# Altium footprint library SOURIAU THD.PcbLib: 34 footprints (part 2 of 5) (continued)
## SOURIAU_EDA-02444-V1-0 [mm] "Adapter Kit For PCB Mount For SOURIAU UTG02028S03, 28 Poles, Shell Size 20, Metalok Bantam Circular Female Connecteur" (continued)
Mechanical 14:
  drawing of 163 lines, arcs and shapes, not listed
  text "1" at -0.331,2.965 h1
  text "5" at 2.962,-2.053 h1
  text "10" at -8.041,1.315 h1
  text "15" at 11.634,-3.04 h1
  text "20" at 0,7.2 h1
  text "25" at -10.429,-5.998 h1
3D body "SOURIAU_EDA-02444-V1-0.stp": height 37, standoff -5.61, extent -18.375,-18.375 18.375,18.375

## SOURIAU_EDA-02510-V1-0 [mm] "Adapter Kit For PCB Mount For SOURIAU UTO02448P21T, 19 Poles, Shell Size 16, UT Bantam Circular Male Connector"
height 33.7
pads (23):
  round 1.9 hole 1.2: 1(0,0) 2(2.75,2.8) 3(3.8,-1) 4(1,-3.8) 5(-2.75,-2.8) 6(-3.8,1) 7(-1,3.8) 8(0,7.5) 9(3.75,6.5) 10(6.5,3.75) 11(7.5,0) 12(6.5,-3.75) 13(3.75,-6.5) 14(0,-7.5) 15(-3.75,-6.5) 16(-6.5,-3.75) 17(-7.5,0) 18(-6.5,3.75) 19(-3.75,6.5)
  round 6.2 hole 3.2: MECH1(-12.3,12.3) MECH2(12.3,12.3) MECH3(-12.3,-12.3) MECH4(12.3,-12.3)
Top Overlay:
  circle w0.2: c-3.75,-6.5 r1.5
  circle w0.2: c-3.75,-6.5 r1.6
  circle w0.2: c-3.75,-6.5 r1.6
  circle w0.2: c-2.75,-2.8 r1.5
  circle w0.2: c-2.75,-2.8 r1.6
  circle w0.2: c-2.75,-2.8 r1.6
  circle w0.2: c6.5,3.75 r1.5
  circle w0.2: c6.5,3.75 r1.6
  circle w0.2: c6.5,3.75 r1.6
  circle w0.2: c-3.75,6.5 r1.5
  circle w0.2: c-3.75,6.5 r1.6
  circle w0.2: c-3.75,6.5 r1.6
  circle w0.2: c-6.5,3.75 r1.6
  circle w0.2: c-7.5,0 r1.6
  circle w0.2: c-6.5,-3.75 r1.6
  circle w0.2: c0,-7.5 r1.6
  circle w0.2: c3.75,-6.5 r1.6
  circle w0.2: c6.5,-3.75 r1.6
  circle w0.2: c7.5,0 r1.6
  circle w0.2: c3.75,6.5 r1.6
  circle w0.2: c0,7.5 r1.6
  circle w0.2: c-1,3.8 r1.6
  circle w0.2: c-3.8,1 r1.6
  circle w0.2: c1,-3.8 r1.6
  circle w0.2: c3.8,-1 r1.6
  circle w0.2: c2.75,2.8 r1.6
  circle w0.2: c0,0 r1.5
  circle w0.2: c0,0 r1.6
  circle w0.2: c0,0 r1.6
  circle w0.2: c0,0 r12.65
  lines w0.2: -15.6,-11.134 -15.6,11.134 ; -11.397,5.489 -13.16,6.507 -12.215,8.143 -10.452,7.126 ; -11.134,-15.6 11.134,-15.6 ; -11.134,15.6 11.134,15.6 ; -7.088,-1.546 -6.912,-2.204 ; -7.088,1.546 -6.912,2.204 ; -5.369,-4.881 -4.881,-5.369 ; -5.369,4.881 -4.841,5.409 ; -4.867,9.473 ccw(c0,0) -10.426,-2.172 -11.442,-2.445 ccw(c0,0) -11.131,-3.604 -10.115,-3.332 ccw(c0,0) -7.294,-7.76 -7.97,-8.565 ccw(c0,0) -7.051,-9.337 -6.375,-8.531 ccw(c0,0) -4.454,-9.674 ; -3.374,-0.542 -3.176,-1.258 ; -2.669,2.131 -2.131,2.669 ; -2.204,-6.912 -1.546,-7.088 ; -1.955,10.469 cw(c0,0) -1.4,10.558 -1.4,11.616 cw(c0,0) 1.4,11.616 1.4,10.558 cw(c0,0) 7.083,7.953 ; -1.649,-10.521 ccw(c0,0) 5.607,-9.054 6.211,-9.916 ccw(c0,0) 7.194,-9.227 6.59,-8.366 ccw(c0,0) 10.54,-1.524 11.588,-1.616 ccw(c0,0) 11.693,-0.421 10.645,-0.329 ccw(c0,0) 8.834,5.948 ; -1.204,-3.212 -0.546,-3.388 ; -0.945,-12.615 -0.945,-14.65 0.945,-14.65 0.945,-12.615 ; -0.583,5.345 -0.417,5.955 ; 1.121,1.142 1.629,1.658 ; 1.546,-7.088 2.204,-6.912 ; 1.546,7.088 2.204,6.912 ; 1.875,0.75 2.075,0.925 2.075,-0.243 ; 1.889,-0.243 2.275,-0.243 ; 2.131,-2.669 2.669,-2.131 ; 3.176,1.258 3.374,0.542 ; 4.881,-5.369 5.369,-4.881 ; 4.881,5.369 5.369,4.881 ; 6.912,-2.204 7.088,-1.546 ; 6.912,2.204 7.088,1.546 ; 10.452,7.126 12.215,8.143 13.16,6.507 11.397,5.489 ; 15.6,-11.134 15.6,11.134
  text "5" at -1.8,-5.75 h1.2
  text "10" at 6.44,6.105 h1.2
  text "19" at -4.25,8.95 h1.2
  text "15" at -3.742,-9.976 h1.2
Mechanical 8:
  drawing of 184 lines, arcs and shapes, not listed
Mechanical 14:
  circle w0.1: c-3.75,-6.5 r1.6
  circle w0.1: c-2.75,-2.8 r1.6
  circle w0.1: c6.5,3.75 r1.6
  circle w0.1: c-3.75,6.5 r1.6
  circle w0.1: c-6.5,3.75 r1.6
  circle w0.1: c-7.5,0 r1.6
  circle w0.1: c-6.5,-3.75 r1.6
  circle w0.1: c0,-7.5 r1.6
  circle w0.1: c3.75,-6.5 r1.6
  circle w0.1: c6.5,-3.75 r1.6
  circle w0.1: c7.5,0 r1.6
  circle w0.1: c3.75,6.5 r1.6
  circle w0.1: c0,7.5 r1.6
  circle w0.1: c-1,3.8 r1.6
  circle w0.1: c-3.8,1 r1.6
  circle w0.1: c1,-3.8 r1.6
  circle w0.1: c3.8,-1 r1.6
  circle w0.1: c2.75,2.8 r1.6
  circle w0.1: c0,0 r1.6
  circle w0.1: c-12.3,12.3 r2.8
  circle w0.1: c12.3,12.3 r2.8
  circle w0.1: c12.3,-12.3 r2.8
  circle w0.1: c-12.3,-12.3 r2.8
  circle w0.1: c0,0 r12.65
  lines w0.1: -11.397,5.489 -13.16,6.507 -12.215,8.143 -10.452,7.126 ; -7.088,-1.546 -6.912,-2.204 ; -7.088,1.546 -6.912,2.204 ; -5.369,-4.881 -4.881,-5.369 ; -5.369,4.881 -4.9,5.35 ; -3.374,-0.542 -3.176,-1.258 ; -2.669,2.131 -2.131,2.669 ; -2.204,-6.912 -1.546,-7.088 ; -1.204,-3.212 -0.546,-3.388 ; -0.945,-12.615 -0.945,-14.65 0.945,-14.65 0.945,-12.615 ; -0.583,5.345 -0.417,5.955 ; 1.121,1.142 1.629,1.658 ; 1.546,-7.088 2.204,-6.912 ; 1.546,7.088 2.204,6.912 ; 2.131,-2.669 2.669,-2.131 ; 3.176,1.258 3.374,0.542 ; 4.881,-5.369 5.369,-4.881 ; 4.881,5.369 5.369,4.881 ; 6.912,-2.204 7.088,-1.546 ; 6.912,2.204 7.088,1.546 ; 10.452,7.126 12.215,8.143 13.16,6.507 11.397,5.489 ; -15.6,-14.1 -15.6,14.1 -14.1,15.6 14.1,15.6 15.6,14.1 15.6,-14.1 14.1,-15.6 -14.1,-15.6 -15.6,-14.1 ; -13.462,-12.656 ccw(c-13.27,-12.86) -13.19,-13.128 cw(c-13.049,-13.598) -12.572,-13.485 ccw(c-12.3,-13.42) -12.028,-13.485 cw(c-11.551,-13.598) -11.41,-13.128 ccw(c-11.33,-12.86) -11.138,-12.656 cw(c-10.802,-12.3) -11.138,-11.944 ccw(c-11.33,-11.74) -11.41,-11.472 cw(c-11.551,-11.002) -12.028,-11.115 ccw(c-12.3,-11.18) -12.572,-11.115 cw(c-13.049,-11.002) -13.19,-11.472 ccw(c-13.27,-11.74) -13.462,-11.944 cw(c-13.798,-12.3) -13.462,-12.656 ; -13.462,11.944 ccw(c-13.27,11.74) -13.19,11.472 cw(c-13.049,11.002) -12.572,11.115 ccw(c-12.3,11.18) -12.028,11.115 cw(c-11.551,11.002) -11.41,11.472 ccw(c-11.33,11.74) -11.138,11.944 cw(c-10.802,12.3) -11.138,12.656 ccw(c-11.33,12.86) -11.41,13.128 cw(c-11.551,13.598) -12.028,13.485 ccw(c-12.3,13.42) -12.572,13.485 cw(c-13.049,13.598) -13.19,13.128 ccw(c-13.27,12.86) -13.462,12.656 cw(c-13.798,12.3) -13.462,11.944 ; -11.442,-2.445 ccw(c0,0) -11.131,-3.604 -10.115,-3.332 ccw(c0,0) -7.294,-7.76 -7.97,-8.565 ccw(c0,0) -7.051,-9.337 -6.375,-8.531 ccw(c0,0) 5.607,-9.054 6.211,-9.916 ccw(c0,0) 7.194,-9.227 6.59,-8.366 ccw(c0,0) 10.54,-1.524 11.588,-1.616 ccw(c0,0) 11.693,-0.421 10.645,-0.329 ccw(c0,0) 1.4,10.558 1.4,11.616 ccw(c0,0) -1.4,11.616 -1.4,10.558 ccw(c0,0) -10.426,-2.172 -11.442,-2.445 ; 11.138,-12.656 ccw(c11.33,-12.86) 11.41,-13.128 cw(c11.551,-13.598) 12.028,-13.485 ccw(c12.3,-13.42) 12.572,-13.485 cw(c13.049,-13.598) 13.19,-13.128 ccw(c13.27,-12.86) 13.462,-12.656 cw(c13.798,-12.3) 13.462,-11.944 ccw(c13.27,-11.74) 13.19,-11.472 cw(c13.049,-11.002) 12.572,-11.115 ccw(c12.3,-11.18) 12.028,-11.115 cw(c11.551,-11.002) 11.41,-11.472 ccw(c11.33,-11.74) 11.138,-11.944 cw(c10.802,-12.3) 11.138,-12.656 ; 11.138,11.944 ccw(c11.33,11.74) 11.41,11.472 cw(c11.551,11.002) 12.028,11.115 ccw(c12.3,11.18) 12.572,11.115 cw(c13.049,11.002) 13.19,11.472 ccw(c13.27,11.74) 13.462,11.944 cw(c13.798,12.3) 13.462,12.656 ccw(c13.27,12.86) 13.19,13.128 cw(c13.049,13.598) 12.572,13.485 ccw(c12.3,13.42) 12.028,13.485 cw(c11.551,13.598) 11.41,13.128 ccw(c11.33,12.86) 11.138,12.656 cw(c10.802,12.3) 11.138,11.944
  text "15" at -4.607,-7.1 h1
  text "5" at -3.15,-3.4 h1
  text "10" at 5.643,3.15 h1
  text "19" at -4.579,5.9 h1
  text "1" at -0.143,-0.6 h1
3D body "SOURIAU_EDA-02510-V1-0.stp": height 33.7, standoff -13.8, extent -15.6,-15.6 15.6,15.6

## SOURIAU_EDA-02569-V1-0 [mm] "Adapter Kit For PCB Mount For SOURIAU UTO0104S21T, 4 Poles, Shell Size 10, UT Bantam Circular Female Connector. UTO Series"
height 24.3
pads (8):
  round 1.9 hole 1.2: 1(0,3) 2(-3,0) 3(0,-3) 4(3,0)
  round 6.2 hole 3.2: MECH1(-9.13,9.13) MECH2(-9.13,-9.13) MECH3(9.13,-9.13) MECH4(9.13,9.13)
Top Overlay:
  circle w0.2: c3,0 r1.6
  circle w0.2: c0,-3 r1.6
  circle w0.2: c-3,0 r1.6
  circle w0.2: c0,3 r1.5
  circle w0.2: c0,3 r1.7
  circle w0.2: c0,0 r7.455
  circle w0.2: c0,0 r5.15
  lines w0.2: -11.91,-6.5 -11.91,6.5 ; -6.877,2.879 -7.819,3.423 cw(c0,0) -6.472,5.564 -4.962,5.564 ; -6.5,-11.91 6.5,-11.91 ; -6.5,11.91 6.5,11.91 ; -2.337,-7.079 -1.582,-8.387 ccw(c0,0) 0.945,-8.483 0.945,-7.395 ; -1.869,-1.131 -1.131,-1.869 ; -1.869,1.131 -1.131,1.869 ; 1.131,-1.869 1.869,-1.131 ; 5.932,4.516 6.874,5.06 cw(c0,0) 8.054,2.823 7.299,1.516 ; 11.91,-6.5 11.91,6.5 ; -6.785,-0.938 ccw(c0,0) -6.345,-2.58 -5.795,-2.433 ccw(c0,0) -4.654,-4.224 -5.02,-4.66 ccw(c0,0) -3.718,-5.753 -3.352,-5.317 ccw(c0,0) 2.876,-5.589 3.202,-6.055 ccw(c0,0) 4.595,-5.08 4.268,-4.614 ccw(c0,0) 6.129,-1.39 6.697,-1.439 ccw(c0,0) 6.845,0.254 6.278,0.304 ccw(c0,0) 1.65,6.065 1.65,6.648 ccw(c0,0) -1.65,6.648 -1.65,6.065 ccw(c0,0) -6.235,-0.791 -6.785,-0.938
  text "4" at 2.375,2.15 h1.2
  text "1" at -2.8,2.375 h1.2
  text "2" at -3.15,-3.4 h1.2
  text "3" at 2.275,-3.45 h1.2
Mechanical 8:
  lines w0.1: -9.63,-9.13 -9.13,-9.13 ; -9.63,9.13 -9.13,9.13 ; -9.13,-9.63 -9.13,-9.13 ; -9.13,-8.63 -9.13,-9.13 ; -9.13,8.63 -9.13,9.13 ; -9.13,9.63 -9.13,9.13 ; -8.63,-9.13 -9.13,-9.13 ; -8.63,9.13 -9.13,9.13 ; -3.5,0 -3,0 ; -3,-0.5 -3,0 ; -3,0.5 -3,0 ; -2.5,0 -3,0 ; -0.5,-3 0,-3 ; -0.5,0 0,0 ; -0.5,3 0,3 ; 0,-3.5 0,-3 ; 0,-2.5 0,-3 ; 0,-0.5 0,0 ; 0,0.5 0,0 ; 0,2.5 0,3 ; 0,3.5 0,3 ; 0.5,-3 0,-3 ; 0.5,0 0,0 ; 0.5,3 0,3 ; 2.5,0 3,0 ; 3,-0.5 3,0 ; 3,0.5 3,0 ; 3.5,0 3,0 ; 8.63,-9.13 9.13,-9.13 ; 8.63,9.13 9.13,9.13 ; 9.13,-9.63 9.13,-9.13 ; 9.13,-8.63 9.13,-9.13 ; 9.13,8.63 9.13,9.13 ; 9.13,9.63 9.13,9.13 ; 9.63,-9.13 9.13,-9.13 ; 9.63,9.13 9.13,9.13
Mechanical 14:
  circle w0.1: c-9.13,-9.13 r2.8
  circle w0.1: c9.13,-9.13 r2.8
  circle w0.1: c9.13,9.13 r2.8
  circle w0.1: c-9.13,9.13 r2.8
  circle w0.1: c0,0 r5.15
  circle w0.1: c0,0 r7.455
  circle w0.1: c3,0 r1.6
  circle w0.1: c0,-3 r1.6
  circle w0.1: c-3,0 r1.6
  circle w0.1: c0,3 r1.6
  lines w0.1: -6.877,2.879 -7.819,3.423 cw(c0,0) -6.472,5.564 -4.962,5.564 ; -2.337,-7.079 -1.582,-8.387 ccw(c0,0) 0.945,-8.483 0.945,-7.395 ; -1.869,-1.131 -1.131,-1.869 ; -1.869,1.131 -1.131,1.869 ; 1.131,-1.869 1.869,-1.131 ; 5.932,4.516 6.874,5.06 cw(c0,0) 8.054,2.823 7.299,1.516 ; -11.91,-10.229 -11.91,10.229 -10.229,11.91 10.229,11.91 11.91,10.229 11.91,-10.229 10.229,-11.91 -10.229,-11.91 -11.91,-10.229 ; -10.292,-9.486 ccw(c-10.1,-9.69) -10.02,-9.958 cw(c-9.879,-10.428) -9.402,-10.315 ccw(c-9.13,-10.25) -8.858,-10.315 cw(c-8.381,-10.428) -8.24,-9.958 ccw(c-8.16,-9.69) -7.968,-9.486 cw(c-7.632,-9.13) -7.968,-8.774 ccw(c-8.16,-8.57) -8.24,-8.302 cw(c-8.381,-7.832) -8.858,-7.945 ccw(c-9.13,-8.01) -9.402,-7.945 cw(c-9.879,-7.832) -10.02,-8.302 ccw(c-10.1,-8.57) -10.292,-8.774 cw(c-10.628,-9.13) -10.292,-9.486 ; -10.292,8.774 ccw(c-10.1,8.57) -10.02,8.302 cw(c-9.879,7.832) -9.402,7.945 ccw(c-9.13,8.01) -8.858,7.945 cw(c-8.381,7.832) -8.24,8.302 ccw(c-8.16,8.57) -7.968,8.774 cw(c-7.632,9.13) -7.968,9.486 ccw(c-8.16,9.69) -8.24,9.958 cw(c-8.381,10.428) -8.858,10.315 ccw(c-9.13,10.25) -9.402,10.315 cw(c-9.879,10.428) -10.02,9.958 ccw(c-10.1,9.69) -10.292,9.486 cw(c-10.628,9.13) -10.292,8.774 ; -6.785,-0.938 ccw(c0,0) -6.345,-2.58 -5.795,-2.433 ccw(c0,0) -4.654,-4.224 -5.02,-4.66 ccw(c0,0) -3.718,-5.753 -3.352,-5.317 ccw(c0,0) 2.876,-5.589 3.202,-6.055 ccw(c0,0) 4.595,-5.08 4.268,-4.614 ccw(c0,0) 6.129,-1.39 6.697,-1.439 ccw(c0,0) 6.845,0.254 6.278,0.304 ccw(c0,0) 1.65,6.065 1.65,6.648 ccw(c0,0) -1.65,6.648 -1.65,6.065 ccw(c0,0) -6.235,-0.791 -6.785,-0.938 ; 7.968,-9.486 ccw(c8.16,-9.69) 8.24,-9.958 cw(c8.381,-10.428) 8.858,-10.315 ccw(c9.13,-10.25) 9.402,-10.315 cw(c9.879,-10.428) 10.02,-9.958 ccw(c10.1,-9.69) 10.292,-9.486 cw(c10.628,-9.13) 10.292,-8.774 ccw(c10.1,-8.57) 10.02,-8.302 cw(c9.879,-7.832) 9.402,-7.945 ccw(c9.13,-8.01) 8.858,-7.945 cw(c8.381,-7.832) 8.24,-8.302 ccw(c8.16,-8.57) 7.968,-8.774 cw(c7.632,-9.13) 7.968,-9.486 ; 7.968,8.774 ccw(c8.16,8.57) 8.24,8.302 cw(c8.381,7.832) 8.858,7.945 ccw(c9.13,8.01) 9.402,7.945 cw(c9.879,7.832) 10.02,8.302 ccw(c10.1,8.57) 10.292,8.774 cw(c10.628,9.13) 10.292,9.486 ccw(c10.1,9.69) 10.02,9.958 cw(c9.879,10.428) 9.402,10.315 ccw(c9.13,10.25) 8.858,10.315 cw(c8.381,10.428) 8.24,9.958 ccw(c8.16,9.69) 7.968,9.486 cw(c7.632,9.13) 7.968,8.774
  text "2" at -3.4,-0.6 h1.2
  text "3" at -0.4,-3.6 h1.2
  text "4" at 2.571,-0.6 h1.2
  text "1" at -0.143,2.4 h1.2
3D body "SOURIAU_EDA-02569-V1-0.stp": height 32.93, standoff -5.89, extent -12.23,-12.223 12.23,12.224

## SOURIAU_EDA-02570-V1-0 [mm] "Adapter Kit For PCB Mount For SOURIAU UTO01412S21T, 12 Poles, Shell Size 14, UT Bantam Circular Female Connecteur"
height 32.93
pads (16):
  round 1.9 hole 1.2: 1(-1.45,1.5) 2(-0.75,-2.2) 3(2.25,0.35) 4(5.15,2.95) 5(2,5.55) 6(-2,5.55) 7(-5.15,2.95) 8(-5.85,-1.05) 9(-3.85,-4.55) 10(0,-5.95) 11(3.85,-4.55) 12(5.85,-1.09)
  round 6.2 hole 3.2: MECH1(-11.505,11.505) MECH2(11.505,11.505) MECH3(-11.505,-11.505) MECH4(11.505,-11.505)
Top Overlay:
  circle w0.2: c-2,5.55 r1.6
  circle w0.2: c2,5.55 r1.7
  circle w0.2: c5.15,2.95 r1.6
  circle w0.2: c-5.15,2.95 r1.6
  circle w0.2: c-1.45,1.5 r1.7
  circle w0.2: c2.25,0.35 r1.6
  circle w0.2: c5.85,-1.09 r1.7
  circle w0.2: c3.85,-4.55 r1.6
  circle w0.2: c0,-5.95 r1.6
  circle w0.2: c-0.75,-2.2 r1.6
  circle w0.2: c-3.85,-4.55 r1.6
  circle w0.2: c-5.85,-1.05 r1.6
  circle w0.2: c-1.45,1.5 r1.5
  circle w0.2: c2,5.55 r1.5
  circle w0.2: c5.85,-1.09 r1.5
  circle w0.2: c0.043,-0.043 r11.113
  lines w0.2: -14.285,-8.914 -14.285,8.914 ; -10.012,4.689 -11.176,5.361 cw(c0,0) -9.541,7.913 -7.717,7.913 ; -8.914,-14.285 8.914,-14.285 ; -8.914,14.285 8.914,14.285 ; -5.574,0.526 -5.426,1.374 ; -5.056,-2.439 -4.644,-3.161 ; -3.916,3.969 -3.234,4.531 ; -2.93,-10.75 -2.082,-12.219 ccw(c0,0) 0.945,-12.359 0.945,-11.119 ; -2.346,-5.097 -1.504,-5.403 ; -1.153,-0.072 -1.047,-0.628 ; -0.4,5.55 0.4,5.55 ; 0.469,-1.164 1.031,-0.686 ; 1.504,-5.403 2.346,-5.097 ; 3.234,4.531 3.916,3.969 ; 3.441,1.418 3.959,1.882 ; 3.681,7.467 ccw(c0,0) 6.533,-5.16 ; 4.651,-3.165 5.049,-2.475 ; 6.161,5.599 cw(c0,0) 8.013,-2.258 ; 7.608,-5.452 cw(c0,0) 6.043,-7.148 6.604,-7.95 cw(c0,0) 5.212,-8.925 4.65,-8.123 cw(c0,0) -5.34,-7.687 -5.97,-8.437 cw(c0,0) -7.272,-7.344 -6.643,-6.594 cw(c0,0) -8.784,-3.234 -9.729,-3.487 cw(c0,0) -10.169,-1.845 -9.224,-1.592 cw(c0,0) -1.65,9.213 -1.65,10.202 cw(c0,0) 1.65,10.202 1.65,9.213 cw(c0,0) 9.36,0.034 10.335,-0.051 cw(c0,0) 10.187,-1.744 9.212,-1.659 cw(c0,0) 9.006,-2.551 ; 9.126,6.36 10.231,6.998 cw(c0,0) 11.623,4.306 10.775,2.838 ; 14.285,-8.914 14.285,8.914
  text "1" at -3.475,-1.3 h1.2
  text "5" at 4.275,5.525 h1.2
  text "12" at 7.075,-4.55 h1.2
Mechanical 8:
  lines w0.1: -12.005,-11.505 -11.505,-11.505 ; -12.005,11.505 -11.505,11.505 ; -11.505,-12.005 -11.505,-11.505 ; -11.505,-11.005 -11.505,-11.505 ; -11.505,11.005 -11.505,11.505 ; -11.505,12.005 -11.505,11.505 ; -11.005,-11.505 -11.505,-11.505 ; -11.005,11.505 -11.505,11.505 ; -6.35,-1.05 -5.85,-1.05 ; -5.85,-1.55 -5.85,-1.05 ; -5.85,-0.55 -5.85,-1.05 ; -5.65,2.95 -5.15,2.95 ; -5.35,-1.05 -5.85,-1.05 ; -5.15,2.45 -5.15,2.95 ; -5.15,3.45 -5.15,2.95 ; -4.65,2.95 -5.15,2.95 ; -4.35,-4.55 -3.85,-4.55 ; -3.85,-5.05 -3.85,-4.55 ; -3.85,-4.05 -3.85,-4.55 ; -3.35,-4.55 -3.85,-4.55 ; -2.5,5.55 -2,5.55 ; -2,5.05 -2,5.55 ; -2,6.05 -2,5.55 ; -1.95,1.5 -1.45,1.5 ; -1.5,5.55 -2,5.55 ; -1.45,1 -1.45,1.5 ; -1.45,2 -1.45,1.5 ; -1.25,-2.2 -0.75,-2.2 ; -0.95,1.5 -1.45,1.5 ; -0.75,-2.7 -0.75,-2.2 ; -0.75,-1.7 -0.75,-2.2 ; -0.5,-5.95 0,-5.95 ; -0.354,-0.354 0,0 ; -0.354,0.354 0,0 ; -0.25,-2.2 -0.75,-2.2 ; 0,-6.45 0,-5.95 ; 0,-5.45 0,-5.95 ; 0.354,-0.354 0,0 ; 0.354,0.354 0,0 ; 0.5,-5.95 0,-5.95 ; 1.5,5.55 2,5.55 ; 1.75,0.35 2.25,0.35 ; 2,5.05 2,5.55 ; 2,6.05 2,5.55 ; 2.25,-0.15 2.25,0.35 ; 2.25,0.85 2.25,0.35 ; 2.5,5.55 2,5.55 ; 2.75,0.35 2.25,0.35 ; 3.35,-4.55 3.85,-4.55 ; 3.85,-5.05 3.85,-4.55 ; 3.85,-4.05 3.85,-4.55 ; 4.35,-4.55 3.85,-4.55 ; 4.65,2.95 5.15,2.95 ; 5.15,2.45 5.15,2.95 ; 5.15,3.45 5.15,2.95 ; 5.35,-1.09 5.85,-1.09 ; 5.65,2.95 5.15,2.95 ; 5.85,-1.59 5.85,-1.09 ; 5.85,-0.59 5.85,-1.09 ; 6.35,-1.09 5.85,-1.09 ; 11.005,-11.505 11.505,-11.505 ; 11.005,11.505 11.505,11.505 ; 11.505,-12.005 11.505,-11.505 ; 11.505,-11.005 11.505,-11.505 ; 11.505,11.005 11.505,11.505 ; 11.505,12.005 11.505,11.505 ; 12.005,-11.505 11.505,-11.505 ; 12.005,11.505 11.505,11.505
Mechanical 14:
  circle w0.1: c0.043,-0.043 r11.113
  circle w0.1: c0,0 r8.325
  circle w0.1: c-2,5.55 r1.6
  circle w0.1: c2,5.55 r1.6
  circle w0.1: c5.15,2.95 r1.6
  circle w0.1: c-5.15,2.95 r1.6
  circle w0.1: c-1.45,1.5 r1.6
  circle w0.1: c2.25,0.35 r1.6
  circle w0.1: c5.85,-1.09 r1.6
  circle w0.1: c3.85,-4.55 r1.6
  circle w0.1: c0,-5.95 r1.6
  circle w0.1: c-0.75,-2.2 r1.6
  circle w0.1: c-3.85,-4.55 r1.6
  circle w0.1: c-5.85,-1.05 r1.6
  circle w0.1: c11.505,11.505 r2.8
  circle w0.1: c-11.505,11.505 r2.8
  circle w0.1: c-11.505,-11.505 r2.8
  circle w0.1: c11.505,-11.505 r2.8
  lines w0.1: -10.012,4.689 -11.176,5.361 cw(c0,0) -9.541,7.913 -7.717,7.913 ; -5.574,0.526 -5.426,1.374 ; -5.056,-2.439 -4.644,-3.161 ; -3.916,3.969 -3.234,4.531 ; -2.93,-10.75 -2.082,-12.219 ccw(c0,0) 0.945,-12.359 0.945,-11.119 ; -2.346,-5.097 -1.504,-5.403 ; -1.153,-0.072 -1.047,-0.628 ; -0.4,5.55 0.4,5.55 ; 0.469,-1.164 1.031,-0.686 ; 1.504,-5.403 2.346,-5.097 ; 3.234,4.531 3.916,3.969 ; 3.441,1.418 3.959,1.882 ; 4.651,-3.165 5.049,-2.475 ; 9.126,6.36 10.231,6.998 cw(c0,0) 11.623,4.306 10.775,2.838 ; -14.285,-12.603 -12.603,-14.285 12.603,-14.285 14.285,-12.603 14.285,12.603 12.603,14.285 -12.603,14.285 -14.285,12.603 -14.285,-12.603 ; -12.667,-11.861 ccw(c-13.003,-11.505) -12.667,-11.149 cw(c-12.475,-10.945) -12.395,-10.677 ccw(c-12.254,-10.207) -11.777,-10.32 cw(c-11.505,-10.385) -11.233,-10.32 ccw(c-10.756,-10.207) -10.615,-10.677 cw(c-10.535,-10.945) -10.343,-11.149 ccw(c-10.007,-11.505) -10.343,-11.861 cw(c-10.535,-12.065) -10.615,-12.333 ccw(c-10.756,-12.803) -11.233,-12.69 cw(c-11.505,-12.625) -11.777,-12.69 ccw(c-12.254,-12.803) -12.395,-12.333 cw(c-12.475,-12.065) -12.667,-11.861 ; -12.667,11.149 ccw(c-13.003,11.505) -12.667,11.861 cw(c-12.475,12.065) -12.395,12.333 ccw(c-12.254,12.803) -11.777,12.69 cw(c-11.505,12.625) -11.233,12.69 ccw(c-10.756,12.803) -10.615,12.333 cw(c-10.535,12.065) -10.343,11.861 ccw(c-10.007,11.505) -10.343,11.149 cw(c-10.535,10.945) -10.615,10.677 ccw(c-10.756,10.207) -11.233,10.32 cw(c-11.505,10.385) -11.777,10.32 ccw(c-12.254,10.207) -12.395,10.677 cw(c-12.475,10.945) -12.667,11.149 ; -10.169,-1.845 ccw(c0,0) -9.729,-3.487 -8.784,-3.234 ccw(c0,0) -6.643,-6.594 -7.272,-7.344 ccw(c0,0) -5.97,-8.437 -5.34,-7.687 ccw(c0,0) 4.65,-8.123 5.212,-8.925 ccw(c0,0) 6.604,-7.95 6.043,-7.148 ccw(c0,0) 9.212,-1.659 10.187,-1.744 ccw(c0,0) 10.335,-0.051 9.36,0.034 ccw(c0,0) 1.65,9.213 1.65,10.202 ccw(c0,0) -1.65,10.202 -1.65,9.213 ccw(c0,0) -9.224,-1.592 -10.169,-1.845 ; 10.343,-11.861 ccw(c10.007,-11.505) 10.343,-11.149 cw(c10.535,-10.945) 10.615,-10.677 ccw(c10.756,-10.207) 11.233,-10.32 cw(c11.505,-10.385) 11.777,-10.32 ccw(c12.254,-10.207) 12.395,-10.677 cw(c12.475,-10.945) 12.667,-11.149 ccw(c13.003,-11.505) 12.667,-11.861 cw(c12.475,-12.065) 12.395,-12.333 ccw(c12.254,-12.803) 11.777,-12.69 cw(c11.505,-12.625) 11.233,-12.69 ccw(c10.756,-12.803) 10.615,-12.333 cw(c10.535,-12.065) 10.343,-11.861 ; 10.343,11.149 ccw(c10.007,11.505) 10.343,11.861 cw(c10.535,12.065) 10.615,12.333 ccw(c10.756,12.803) 11.233,12.69 cw(c11.505,12.625) 11.777,12.69 ccw(c12.254,12.803) 12.395,12.333 cw(c12.475,12.065) 12.667,11.861 ccw(c13.003,11.505) 12.667,11.149 cw(c12.475,10.945) 12.395,10.677 ccw(c12.254,10.207) 11.777,10.32 cw(c11.505,10.385) 11.233,10.32 ccw(c10.756,10.207) 10.615,10.677 cw(c10.535,10.945) 10.343,11.149
  text "1" at -1.593,0.9 h1.2
  text "5" at 1.6,4.95 h1.2
  text "12" at 4.993,-1.69 h1.2
3D body "SOURIAU_EDA-02570-V1-0.stp": height 32.93, standoff -5.89, extent -14.605,-14.598 14.605,14.599